# Altium footprint library Herry.PcbLib: 74 footprints (part 2 of 5)
Each footprint in its own frame and in the unit in brackets; x right, y up, seen from the top. Pads: shape width x height; smd on the part's side, far side on the other; paste and mask are expansions set on the pad; w line width, h text height; cw(c..) or ccw(c..) is an arc to the next point about the centre after c.
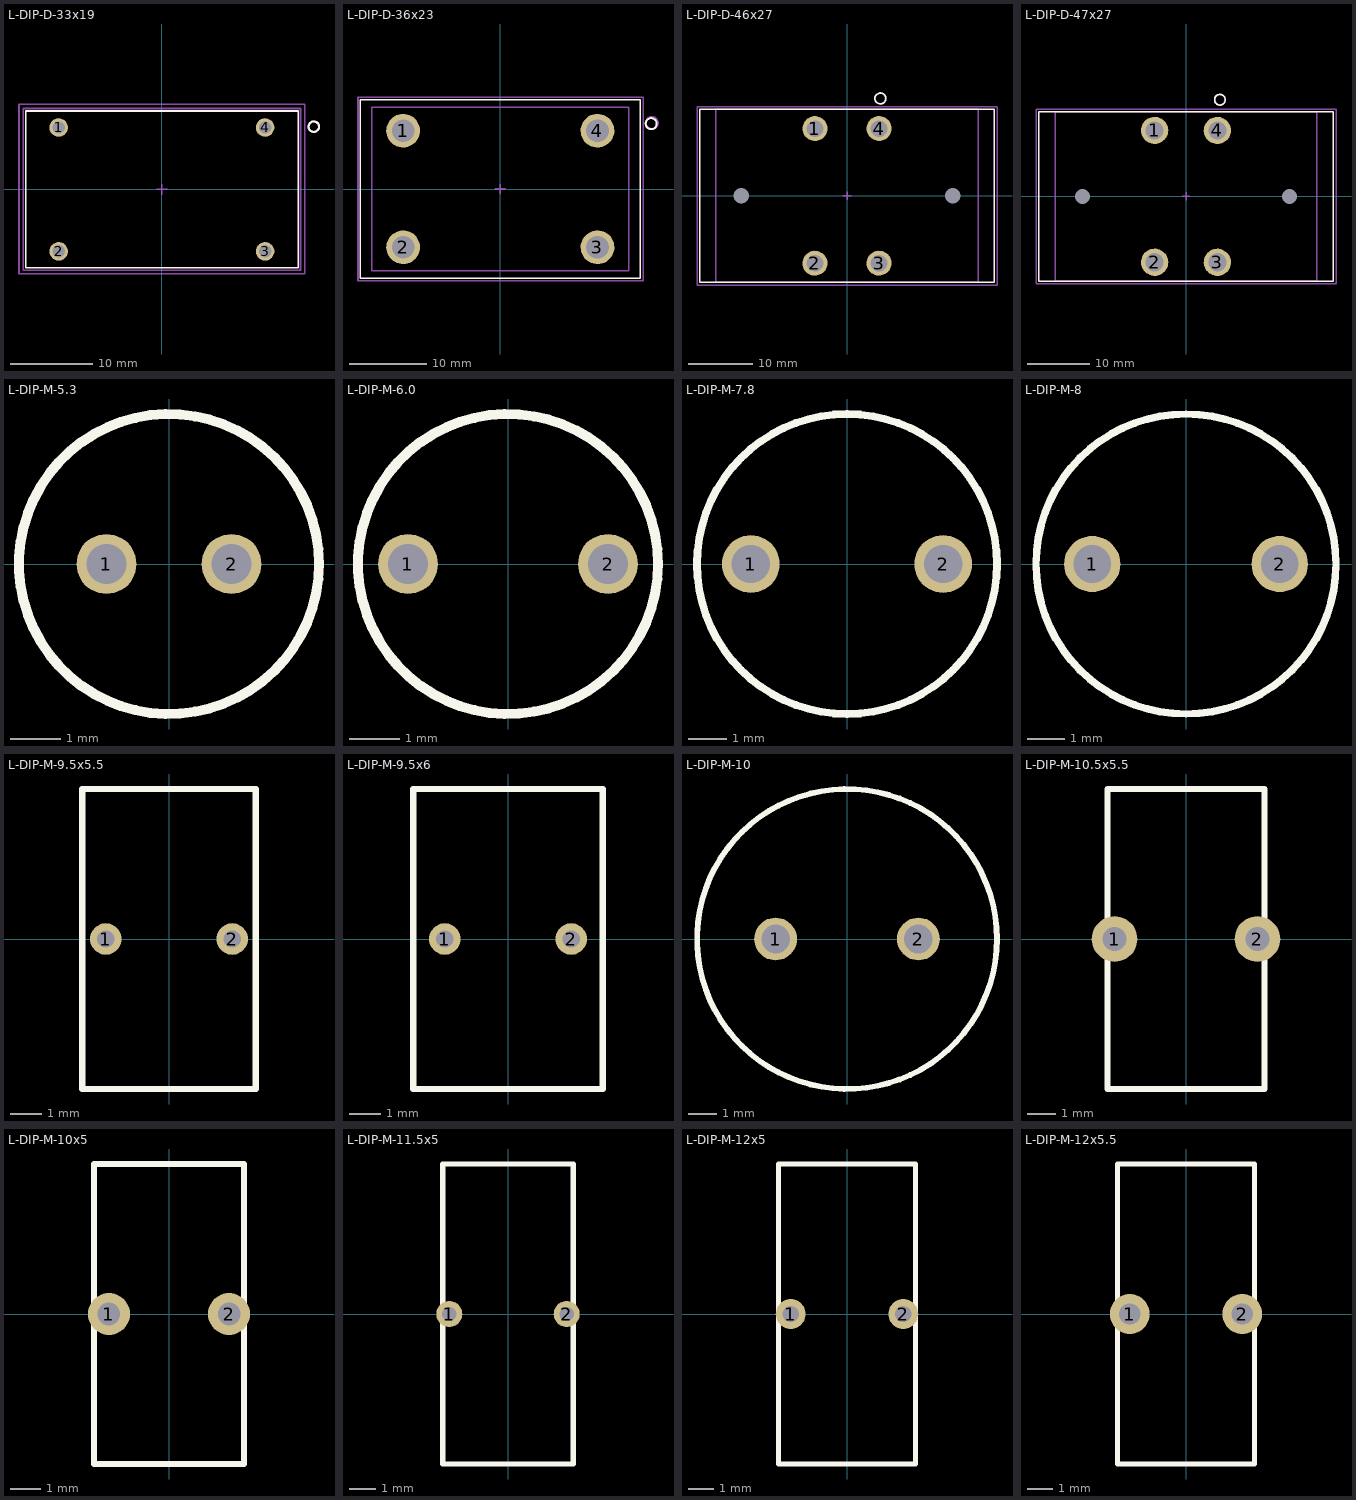
[diagram p1: the footprints below, top view; thin cyan lines are the x and y axes]

## L-DIP-D-33x19 [mm] "THT-4pin- Body 33mmx19mm"
height 39
pads (4):
  round 2.25 hole 1.5: 1(-12.5,7.5) 2(-12.5,-7.5) 3(12.5,-7.5) 4(12.5,7.5)
Top Overlay:
  circle w0.254: c18.4,7.6 r0.632
  lines w0.2: -16.5,-9.5 16.5,-9.5 16.5,9.5 -16.5,9.5 -16.5,-9.5
Mechanical 13:
  lines w0.2: -16.8,-9.8 16.8,-9.8 16.8,9.8 -16.8,9.8 -16.8,-9.8
Mechanical 15:
  circle w0.254: c18.4,7.6 r0.632
  lines w0.2: -0.635,0 0.635,0 ; 0,-0.635 0,0.635 ; -17.3,-10.2 -17.3,10.3 17.3,10.3 17.3,-10.2 -17.3,-10.2
  text ".Designator" at 0,0 h0.76
3D body "7448050490_33x19x39.stp": height 35.25, standoff -4.95, extent -16.5,-9.5 16.5,9.5

## L-DIP-D-36x23 [mm] "THT-4pin- Body 36mmx23mm"
height 36
pads (4):
  round 4.35 hole 2.9: 1(-12.5,7.5) 2(-12.5,-7.5) 3(12.5,-7.5) 4(12.5,7.5)
Top Overlay:
  circle w0.254: c19.4,8.4 r0.707
  lines w0.2: -18,-11.5 18,-11.5 18,11.5 -18,11.5 -18,-11.5
Mechanical 13:
  lines w0.2: -16.51,-10.541 -16.51,10.541 16.51,10.541 16.51,-10.541 -16.51,-10.541
Mechanical 15:
  circle w0.254: c19.5,8.5 r0.781
  lines w0.2: -0.635,0 0.635,0 ; 0,-0.635 0,0.635 ; -18.3,-11.8 -18.3,11.8 18.4,11.8 18.4,-11.8 -18.3,-11.8
  text ".Designator" at 0.1,0 h0.76
3D body "7448052502_36x23x36_without pins.stp": height 31.29, standoff -4.9, extent -16.269,-10.3 16.27,10.3

## L-DIP-D-46x27 [mm] "THT-4pin- Body 46mmx27mm"
height 46
pads (6):
  round 3.9 hole 2.6: 1(-5,10.5) 2(-5,-10.5) 3(5,-10.5) 4(5,10.5)
  round 0 hole 2.4 unplated: mh1(16.5,0) mh2(-16.5,0)
Top Overlay:
  circle w0.254: c5.2,15.2 r0.854
  lines w0.2: -23,-13.5 -23,13.5 23,13.5 23,-13.5 -23,-13.5
Mechanical 13:
  lines w0.2: -20.5,-13.5 20.5,-13.5 20.5,13.5 -20.5,13.5 -20.5,-13.5
Mechanical 15:
  circle w0.254: c5.2,15.2 r0.806
  lines w0.2: -0.635,0 0.635,0 ; 0,-0.635 0,0.635 ; -23.4,-13.9 23.4,-13.9 23.4,13.9 -23.4,13.9 -23.4,-13.9
  text ".Designator" at 0,-0.1 h0.76
3D body "7448061507_46x27x46_wop.stp": height 39.1, standoff -5, extent -20.216,-13.25 20.22,13.25

## L-DIP-D-47x27 [mm] "THT-4pin- Body 47mmx27mm"
height 46
pads (6):
  round 4.35 hole 2.9: 1(-5,10.5) 2(-5,-10.5) 3(5,-10.5) 4(5,10.5)
  round 0 hole 2.4 unplated: mh1(16.5,0) mh2(-16.5,0)
Top Overlay:
  circle w0.254: c5.4,15.4 r0.854
  lines w0.2: -23.5,-13.5 23.5,-13.5 23.5,13.5 -23.5,13.5 -23.5,-13.5
Mechanical 13:
  lines w0.2: -20.8,-13.5 -20.8,13.5 20.8,13.5 20.8,-13.5 -20.8,-13.5
Mechanical 15:
  circle w0.254: c5.4,15.4 r0.806
  lines w0.2: -0.635,0 0.635,0 ; 0,-0.635 0,0.635 ; -23.9,-13.9 -23.9,13.9 23.9,13.9 23.9,-13.9 -23.9,-13.9
  text ".Designator" at 0,-0.1 h0.76
3D body "7448062603_47x27x46_wop.stp": height 39.1, standoff -5, extent -20.528,-13.25 20.528,13.25

## L-DIP-M-5.3 [mm] "THT Inductor, 2-Leads, Body 5.3  mm"
height 8.5
pads (2):
  round 1.2 hole 0.8: 1(-1.25,0) 2(1.25,0)
Top Overlay:
  circle w0.2: c0,0 r3
Mechanical 1:
  circle w0.1: c0,0 r3
3D body "7447462xx.stp": height 7.6, standoff -3.5, extent -2.44,-2.44 2.44,2.45

## L-DIP-M-6.0 [mm] "THT Inductor, 2-Leads, Body 6,0  mm"
height 6.5
pads (2):
  round 1.2 hole 0.8: 1(-2,0) 2(2,0)
Top Overlay:
  circle w0.2: c0,0 r3
Mechanical 1:
  circle w0.1: c0,0 r3
3D body "744779100.stp": height 6.51, standoff -3.99, extent -3,-3 3,3

## L-DIP-M-7.8 [mm] "THT Inductor, 2-Leads, Body 7,8  mm"
height 9.5
pads (2):
  round 1.5 hole 1: 1(-2.5,0) 2(2.5,0)
Top Overlay:
  circle w0.2: c0,0 r3.9
Mechanical 1:
  circle w0.1: c0,0 r3.9
3D body "744772471.stp": height 9.5, standoff -5, extent -3.9,-3.9 3.886,3.895

## L-DIP-M-8 [mm] "THT Inductor, 2-Leads, Body 8,0  mm"
height 12.5
pads (2):
  round 1.5 hole 1: 1(-2.5,0) 2(2.5,0)
Top Overlay:
  circle w0.2: c0,0 r4
Mechanical 1:
  circle w0.1: c0,0 r4
3D body "744743101.stp": height 12.51, standoff -4.99, extent -3.965,-3.956 3.965,3.975

## L-DIP-M-9.5x5.5 [mm] "Body 9.5x5.5mm, 2 leads"
height 9.5
pads (2):
  round 1 hole 0.55: 1(-2,0) 2(2,0)
Top Overlay:
  lines w0.2: -2.75,-4.75 2.75,-4.75 2.75,4.75 -2.75,4.75 -2.75,-4.75
3D body "7447051.stp": height 10.07, standoff -14.75, extent -2.57,-5.049 2.57,5.049

## L-DIP-M-9.5x6 [mm] "Body 9.5x6mm, 2 leads"
height 9.5
pads (2):
  round 1 hole 0.55: 1(-2,0) 2(2,0)
Top Overlay:
  lines w0.2: -3,-4.75 -3,4.75 3,4.75 3,-4.75 -3,-4.75
3D body "7447050.stp": height 9.75, standoff -14.4, extent -2.85,-4.749 2.85,4.749

## L-DIP-M-10 [mm] "THT Inductor, 2-Leads, Body 10,0  mm"
height 14.5
pads (2):
  round 1.5 hole 1: 1(-2.5,0) 2(2.5,0)
Top Overlay:
  circle w0.2: c0,0 r5.25
Mechanical 1:
  circle w0.1: c0,0 r5.25
3D body "744748xxxx.stp": height 14.1, standoff -3.45, extent -4.983,-4.968 4.983,4.969

## L-DIP-M-10.5x5.5 [mm] "Body 10.5x5.5mm, 2 leads"
height 10.5
pads (2):
  round 1.6 hole 0.85: 1(-2.5,0) 2(2.5,0)
Top Overlay:
  lines w0.2: -2.75,-5.25 2.75,-5.25 2.75,5.25 -2.75,5.25 -2.75,-5.25
3D body "7447054.stp": height 11.72, standoff -14.35, extent -3.371,-5.857 3.37,5.857

## L-DIP-M-10x5 [mm] "Body 10x5mm, 2 leads"
height 10
pads (2):
  round 1.4 hole 0.75: 1(-2,0) 2(2,0)
Top Overlay:
  lines w0.2: -2.5,-5 -2.5,5 2.5,5 2.5,-5 -2.5,-5
3D body "7447053.stp": height 10.99, standoff -14.5, extent -3.01,-5.503 3.01,5.502

## L-DIP-M-11.5x5 [mm] "Body 11.5x5mm, 2 leads"
height 11.5
pads (2):
  round 1 hole 0.55: 1(-2.25,0) 2(2.25,0)
Top Overlay:
  lines w0.2: -2.5,-5.75 -2.5,5.75 2.5,5.75 2.5,-5.75 -2.5,-5.75
3D body "7447040.stp": height 12.31, standoff -14.5, extent -2.821,-6.066 2.821,6.067

## L-DIP-M-12x5 [mm] "Body 12x5.5mm, 2 leads"
height 12
pads (2):
  round 1.2 hole 0.65: 1(-2.25,0) 2(2.25,0)
Top Overlay:
  lines w0.2: -2.75,-6 2.75,-6 2.75,6 -2.75,6 -2.75,-6
3D body "7447041.stp": height 12.89, standoff -14.5, extent -3.17,-6.411 3.17,6.412

## L-DIP-M-12x5.5 [mm] "Body 12x5.5mm, 2 leads"
height 12
pads (2):
  round 1.6 hole 0.85: 1(-2.25,0) 2(2.25,0)
Top Overlay:
  lines w0.2: -2.75,-6 2.75,-6 2.75,6 -2.75,6 -2.75,-6
3D body "7447045.stp": height 13.62, standoff -14, extent -3.37,-6.618 3.37,6.62